# Altium footprint library alex_footprint.PcbLib: 262 footprints (part 2 of 17)
Each footprint in its own frame and in the unit in brackets; x right, y up, seen from the top. Pads: shape width x height; smd on the part's side, far side on the other; paste and mask are expansions set on the pad; w line width, h text height; cw(c..) or ccw(c..) is an arc to the next point about the centre after c.
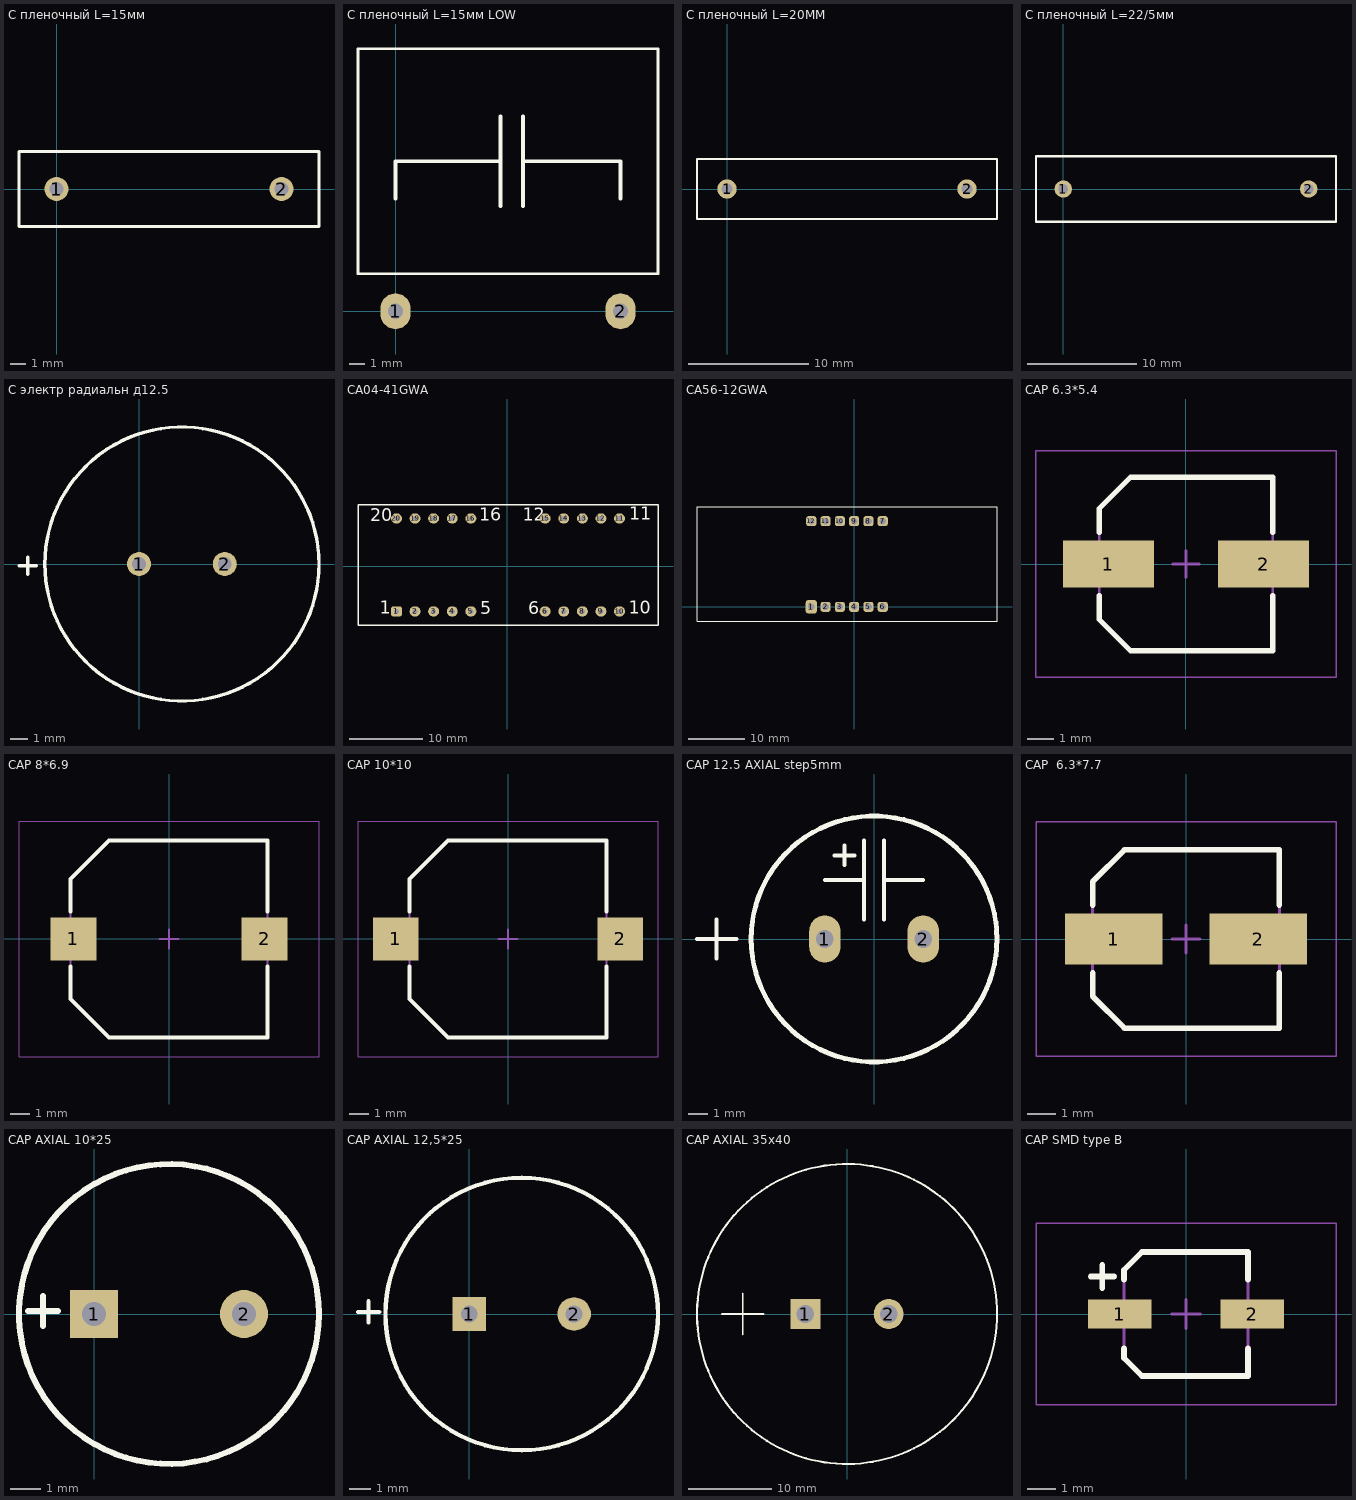
[diagram p1: the footprints below, top view; thin cyan lines are the x and y axes]

## C пленочный L=15мм [mm]
pads (2):
  round 1.6 hole 0.9: 1(0,0) 2(15,0)
Top Overlay:
  lines w0.2: -2.5,-2.5 -2.5,2.5 0,2.5 15,2.5 17.5,2.5 17.5,-2.5 15,-2.5 0,-2.5 -2.5,-2.5

## C пленочный L=15мм LOW [mm]
pads (2):
  oval 2x2.4 hole 1: 1(0,0) 2(15,0)
Top Overlay:
  lines w0.2: -2.5,2.5 -2.5,17.5 0,17.5 15,17.5 17.5,17.5 17.5,2.5 15,2.5 0,2.5 -2.5,2.5
  lines w0.25: 0,7.5 0,9 0,10 7,10 ; 7,7 7,13 ; 8.5,7 8.5,13 ; 8.5,10 15,10 15,7.5

## C пленочный L=20ММ [mm]
pads (2):
  round 1.6 hole 0.9: 1(0,0) 2(20,0)
Top Overlay:
  lines w0.2: -2.5,-2.5 -2.5,2.5 0,2.5 15,2.5 22.5,2.5 22.5,-2.5 15,-2.5 0,-2.5 -2.5,-2.5

## C пленочный L=22/5мм [mm]
pads (2):
  round 1.6 hole 0.9: 1(0,0) 2(22.5,0)
Top Overlay:
  lines w0.2: 14.5,-3 25,-3 25,3 15,3 0,3 -2.5,3 -2.5,-3 0,-3 15,-3

## C электр радиальн д12.5 [mm]
pads (2):
  round 1.4 hole 0.8: 1(0,0) 2(5,0)
Top Overlay:
  circle w0.2: c2.5,0 r8
  lines w0.2: -7.008,-0.1 -5.992,-0.1 ; -6.5,-0.608 -6.5,0.408

## CA04-41GWA [mm]
pads (20):
  rrect50% 1.5x1.4 hole 0.7 unplated mask+0.25: 1(-15.12,-6.2)
  oval 1.5x1.4 hole 0.7 unplated mask+0.25: 2(-12.58,-6.2) 3(-10.04,-6.2) 4(-7.5,-6.2) 5(-4.96,-6.2) 6(5.2,-6.2) 7(7.74,-6.2) 8(10.28,-6.2) 9(12.82,-6.2) 10(15.36,-6.2) 11(15.36,6.5) 12(12.82,6.5) 13(10.28,6.5) 14(7.74,6.5) 15(5.2,6.5) 16(-4.96,6.5) 17(-7.5,6.5) 18(-10.04,6.5) 19(-12.58,6.5) 20(-15.12,6.5)
Top Overlay:
  lines w0.2: -20.38,-8.12 -20.38,8.38 20.62,8.38 20.62,-8.12 -20.38,-8.12
  text "20" at -18.68,5.48 h3
  text "16" at -3.78,5.58 h3
  text "12" at 2.12,5.58 h3
  text "11" at 16.72,5.68 h3
  text "5" at -3.68,-7.22 h3
  text "10" at 16.62,-7.12 h3
  text "6" at 2.92,-7.22 h3
  text "1" at -17.38,-7.12 h3

## CA56-12GWA [mm]
pads (12):
  rrect50% 2x2.4 hole 1.2 unplated mask+0.25: 1(-7.62,0)
  rrect50% 1.8x1.8 hole 1.2 unplated mask+0.25: 2(-5.08,0) 3(-2.54,0) 4(0,0) 5(2.54,0) 6(5.08,0) 7(5.08,15.24) 8(2.54,15.24) 9(0,15.24) 10(-2.54,15.24) 11(-5.08,15.24) 12(-7.62,15.24)
Top Overlay:
  lines w0.2: -27.94,-2.54 25.4,-2.54 25.4,17.78 -27.94,17.78 -27.94,12.7 -27.94,-2.54

## CAP 6.3*5.4 [mm]
height 5.8
pads (2):
  rect 3.45x1.8 smd: 1(-2.95,0) 2(2.95,0)
Top Overlay:
  lines w0.2: -3.3,-1.2 -3.3,-2.1 -2.1,-3.3 3.3,-3.3 3.3,-1.2 ; -3.3,1.2 -3.3,2.1 -2.1,3.3 3.3,3.3 3.3,1.2
Mechanical 13:
  lines w0.1: -3.3,-2.1 -3.3,2.1 -2.1,3.3 3.3,3.3 3.3,-3.3 -2.1,-3.3 -3.3,-2.1
Mechanical 15:
  lines w0.05: -5.7,-4.3 5.7,-4.3 5.7,4.3 -5.7,4.3 -5.7,-4.3
  lines w0.1: -0.5,0 0.5,0 ; 0,-0.5 0,0.5
3D body: height 5.8, standoff 0, extent -3.15,-3.15 3.15,3.15
3D body: height 1.94, standoff 0, extent -3.3,-3.3 3.3,3.3

## CAP 8*6.9 [mm] "Aluminum Electrolytic Capacitor SMD 8*6.9"
height 6.9
pads (2):
  rect 2.4x2.25 smd: 1(-5,0) 2(5,0)
Top Overlay:
  lines w0.2: -5.15,-1.425 -5.15,-3.138 -3.137,-5.15 5.15,-5.15 5.15,-1.425 ; -5.15,1.425 -5.15,3.137 -3.137,5.15 5.15,5.15 5.15,1.425
Mechanical 13:
  lines w0.1: -5.15,-3.138 -5.15,3.137 -3.137,5.15 5.15,5.15 5.15,-5.15 -3.137,-5.15 -5.15,-3.138
Mechanical 15:
  lines w0.05: -7.85,-6.15 7.85,-6.15 7.85,6.15 -7.85,6.15 -7.85,-6.15
  lines w0.1: -0.5,0 0.5,0 ; 0,-0.5 0,0.5

## CAP 10*10 [mm] "Aluminum Electrolytic Capacitor, Body 10,30x10,30x10,30mm, IPC Low Density"
height 10.3
pads (2):
  rect 2.4x2.25 smd: 1(-5.875,0) 2(5.875,0)
Top Overlay:
  lines w0.2: -5.15,-1.425 -5.15,-3.138 -3.137,-5.15 5.15,-5.15 5.15,-1.425 ; -5.15,1.425 -5.15,3.137 -3.137,5.15 5.15,5.15 5.15,1.425
Mechanical 13:
  lines w0.1: -5.15,-3.138 -3.137,-5.15 5.15,-5.15 5.15,5.15 -3.137,5.15 -5.15,3.137 -5.15,-3.138
Mechanical 15:
  lines w0.05: -7.85,-6.15 -7.85,6.15 7.85,6.15 7.85,-6.15 -7.85,-6.15
  lines w0.1: -0.5,0 0.5,0 ; 0,-0.5 0,0.5
3D body: height 3.44, standoff 0, extent -5.15,-5.15 5.15,5.15
3D body: height 10.3, standoff 0, extent -5,-5 5,5

## CAP 12.5 AXIAL step5mm [mm]
pads (2):
  oval 1.6x2.4 hole 0.9 unplated mask+0.25: 1(-2.5,0) 2(2.5,0)
Top Overlay:
  circle w0.25: c0,0 r6.25
  lines w0.2: -9,0 -7,0 ; -8,-1 -8,1 ; -2.5,3 -0.5,3 -0.5,1 -0.5,5 ; -2,4.25 -1,4.25 ; -1.5,3.75 -1.5,4.75 ; 0.5,1 0.5,5 ; 0.5,3 2.5,3 ; 2.5,3 2.5,3

## CAP  6.3*7.7 [mm]
height 6
pads (2):
  rect 3.45x1.8 smd: 1(-2.55,0) 2(2.55,0)
Top Overlay:
  lines w0.2: -3.3,-1.2 -3.3,-2.025 -2.175,-3.15 3.3,-3.15 3.3,-1.2 ; -3.3,1.2 -3.3,2.025 -2.175,3.15 3.3,3.15 3.3,1.2
Mechanical 13:
  lines w0.1: -3.3,-2.025 -3.3,2.025 -2.175,3.15 3.3,3.15 3.3,-3.15 -2.175,-3.15 -3.3,-2.025
Mechanical 15:
  lines w0.05: -5.3,-4.15 5.3,-4.15 5.3,4.15 -5.3,4.15 -5.3,-4.15
  lines w0.1: -0.5,0 0.5,0 ; 0,-0.5 0,0.5
3D body: height 2, standoff 0, extent -3.3,-3.15 3.3,3.15

## CAP AXIAL 10*25 [mm]
pads (2):
  rect 1.6x1.6 hole 0.8: 1(0,0)
  round 1.6 hole 0.8: 2(5,0)
Top Overlay:
  circle w0.2: c2.5,0 r5
  lines w0.2: -2.208,0.1 -1.192,0.1 ; -1.7,-0.408 -1.7,0.608

## CAP AXIAL 12,5*25 [mm]
pads (2):
  rect 1.6x1.6 hole 0.8: 1(0,0)
  round 1.6 hole 0.8: 2(5,0)
Top Overlay:
  circle w0.2: c2.5,0 r6.5
  lines w0.2: -5.308,0.1 -4.292,0.1 ; -4.8,-0.408 -4.8,0.608
3D body "Capasitor.stp": height 26, standoff -1.5, extent -3.75,-6.25 8.75,6.248

## CAP AXIAL 35x40 [mm]
pads (2):
  rect 3.6x3.6 hole 2.1 unplated mask+0.25: 1(-5,0)
  round 3.6 hole 2.1 unplated mask+0.25: 2(5,0)
Top Overlay:
  circle w0.25: c0,0 r18
  lines w0.2: -15,0 -10,0 ; -12.5,-2.5 -12.5,2.5

## CAP SMD type B [mm]
height 6
pads (2):
  rect 2.2x1 smd: 1(-2.3,0) 2(2.3,0)
Top Overlay:
  lines w0.2: -3.3,1.3 -2.5,1.3 ; -2.9,0.9 -2.9,1.7 ; -2.15,-1.2 -2.15,-1.525 -1.525,-2.15 2.15,-2.15 2.15,-1.2 ; -2.15,1.2 -2.15,1.525 -1.525,2.15 2.15,2.15 2.15,1.2
Mechanical 13:
  lines w0.1: -2.15,-1.525 -1.525,-2.15 2.15,-2.15 2.15,2.15 -1.525,2.15 -2.15,1.525 -2.15,-1.525
Mechanical 15:
  lines w0.05: -5.2,-3.15 -5.2,3.15 5.2,3.15 5.2,-3.15 -5.2,-3.15
  lines w0.1: -0.5,0 0.5,0 ; 0,-0.5 0,0.5
3D body: height 2, standoff 0, extent -2.15,-2.15 2.15,2.15
3D body: height 6, standoff 0, extent -2,-2 2,2